# Altium footprint library JL_PCB.PCBLIB: 1112 footprints (part 52 of 71)
Each footprint in its own frame and in the unit in brackets; x right, y up, seen from the top. Pads: shape width x height; smd on the part's side, far side on the other; paste and mask are expansions set on the pad; w line width, h text height; cw(c..) or ccw(c..) is an arc to the next point about the centre after c.
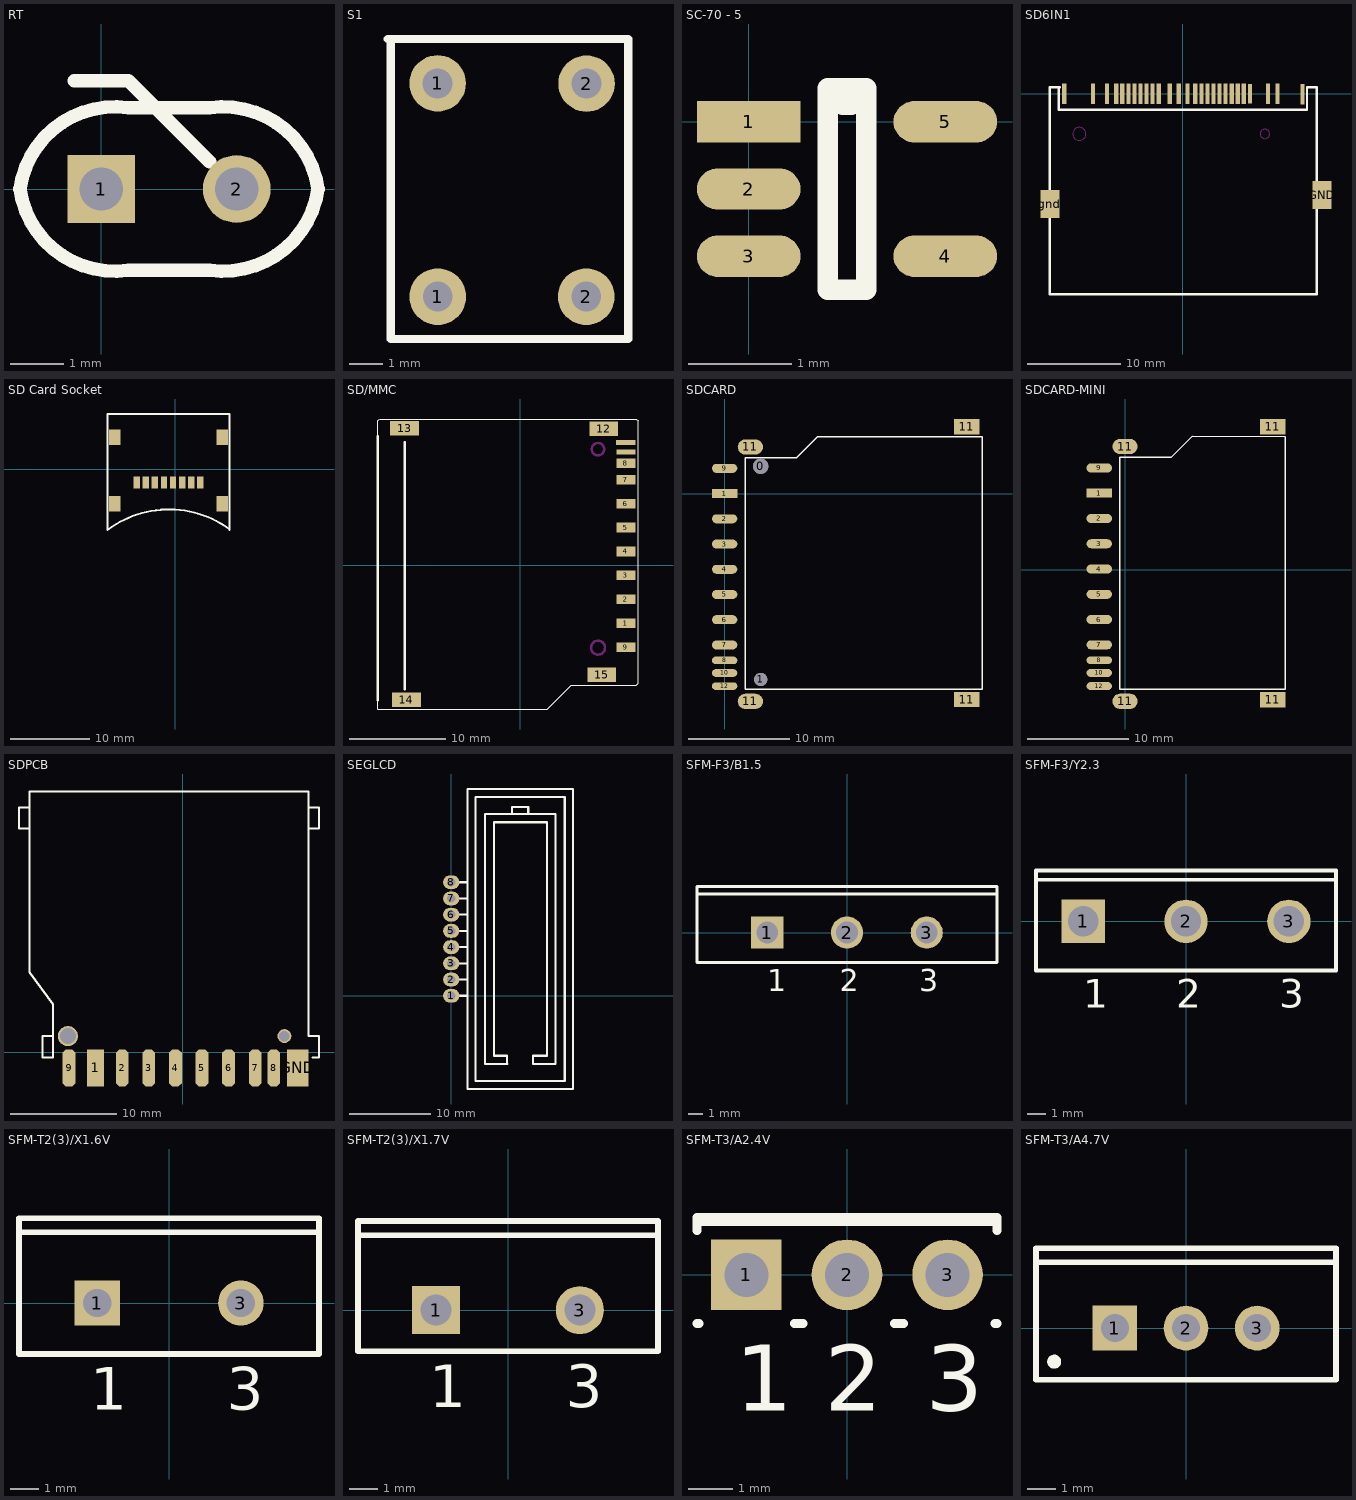
[diagram p51: the footprints below, top view; thin cyan lines are the x and y axes]

## RT [mil]
pads (2):
  rect 50x50 hole 32: 1(0,0)
  round 50 hole 32: 2(100,0)
TopOverlay:
  lines w10: -20,80 20,80 80,20 ; -60,0 ccw(c10,10) 20,-60 80,-60 ccw(c90,10) 160,0 ccw(c90,-10) 80,60 20,60 ccw(c10,-10) -60,0

## S1 [mm]
pads (4):
  round 1.7 hole 0.9: 1(13.618,-10.162) 1(13.62,-16.57) 2(18.08,-16.57) 2(18.09,-10.17)
TopOverlay:
  lines w0.254: 12.12,-8.83 19.34,-8.83 19.34,-17.84 12.21,-17.84 12.21,-8.92

## SC-70 - 5 [mm]
pads (5):
  rect 1x0.4 smd: 1(0,0)
  oval 1x0.4 smd: 2(0,-0.65) 3(0,-1.3) 4(1.9,-1.3) 5(1.9,0)
TopOverlay:
  lines w0.2: 0.765,-1.625 0.765,0.325 1.112,0.325 cw(c0.95,0.325) 0.787,0.325 1.135,0.325 1.135,-1.625 0.765,-1.625

## SD6IN1 [mm]
pads (29):
  rect 0.45x2.2 smd: 1(-9.636,-0.007) 2(-8.136,-0.007) 3(-7.136,-0.007) 4(-6.486,-0.007) 5(-5.836,-0.007) 6(-5.186,-0.007) 7(-4.536,-0.007) 8(-3.886,-0.007) 9(-3.236,-0.007) 10(-2.586,-0.007) 11(-1.396,-0.007) 12(-0.446,-0.007) 13(0.504,-0.007) 14(1.34,-0.007) 15(1.99,-0.007) 16(2.64,-0.007) 17(3.29,-0.007) 18(3.94,-0.007) 19(4.59,-0.007) 20(5.24,-0.007) 24(9.134,-0.007) 25(10.164,-0.007) 25(12.824,-0.058) 26(-12.716,-0.007)
  rect 0.44x2.2 smd: 21(5.89,-0.007) 22(6.54,-0.007)
  rect 0.45x2.1 smd: 23(7.19,-0.007)
  rect 2x3 smd: gnd(-14.246,-11.833) GND(14.929,-10.883)
TopOverlay:
  lines w0.254: -13.408,0.704 -13.306,0.704 ; -13.179,0.704 -14.271,0.704 -14.271,-21.521 14.354,-21.521 14.354,0.704 13.643,0.704 13.313,0.704 13.313,-1.709 -13.306,-1.709 ; -13.306,-1.709 -13.306,0.704 ; -13.306,-1.709 -13.306,0.704
KeepOutLayer:
  lines w0.1: -11.796,-4.307 ccw(c-11.096,-4.307) -10.396,-4.307 ccw(c-11.096,-4.307) -11.796,-4.307 ; 8.304,-4.307 ccw(c8.804,-4.307) 9.304,-4.307 ccw(c8.804,-4.307) 8.304,-4.307

## SD Card Socket [mm]
height 12.75
pads (12):
  rect 0.8x1.5 smd: 1(3.175,-1.651) 2(2.032,-1.651) 3(0.889,-1.651) 4(-0.254,-1.651) 5(-1.397,-1.651) 6(-2.54,-1.651) 7(-3.683,-1.651) 8(-4.826,-1.651)
  rect 1.45x2 smd: ""(-7.62,-4.318) ""(-7.62,4.064) ""(5.969,-4.318) ""(5.969,4.064)
TopOverlay:
  lines w0.254: 6.782,-7.471 ccw(c-0.762,-17.907) -8.509,-7.62 -8.509,6.985 6.858,6.985 6.858,-7.62

## SD/MMC [mm]
pads (15):
  rect 2x1 smd: 1(11.042,-6.055) 2(11.042,-3.555) 3(11.042,-1.055) 4(11.042,1.445) 5(11.042,3.945) 6(11.042,6.445) 7(11.042,8.945) 8(11.042,10.645) 9(11.042,-8.555)
  rect 2x0.5 smd: 10(11.042,11.839) 11(11.017,12.83)
  rect 3x1.5 smd: 12(8.727,14.275) 13(-12.073,14.3) 14(-11.873,-14.025) 15(8.527,-11.425)
TopOverlay:
  lines w0.076: -14.873,12.675 -14.873,15.075 -14.773,15.175 -14.673,15.275 12.127,15.275 12.327,15.075 12.327,-12.325 12.127,-12.525 5.327,-12.525 2.827,-15.025 -14.873,-15.025 ; -14.873,14.775 -14.873,-15.025 ; -14.873,-15.025 -14.873,-15.025
  lines w0.254: -14.873,-14.1 -14.873,13.5 ; -12.073,-12.925 -12.073,12.875
TopPaste:
  circle w0.064: c-14.659,13.624 r0.032
KeepOutLayer:
  circle w0.254: c8.127,12.125 r0.65
  circle w0.254: c8.127,-8.598 r0.727

## SDCARD [mil]
pads (17):
  round 59.06 hole 59.06: 0(140,106)
  rect 98.42x35 smd: 1(0,0)
  round 51.18 hole 51.18: 1(140,-722)
  oval 98.43x35 smd: 2(0,-98) 3(0,-196) 4(0,-294) 5(0,-392) 6(0,-490) 7(0,-588) 9(0,98)
  oval 98.42x30 smd: 8(0,-648) 10(0,-697) 12(0,-748)
  oval 98.42x59.05 smd: 11(100,-807.09) 11(100,181.1)
  rect 98.42x59.05 smd: 11(940,-800) 11(940,260)
TopOverlay:
  lines w6: 220,140 80,140 ; 780,220 1000,220 1000,-760 880,-760 ; 900,-760 80,-760 80,140 ; 900,220 360,220 280,140 80,140
3D body "User Library-2041021-4.step": height 130.52, standoff -23.02, extent 12,-820 1045.47,281.38

## SDCARD-MINI [mm]
pads (15):
  rect 2.5x0.889 smd: 1(-2.54,7.518)
  oval 2.5x0.889 smd: 2(-2.54,5.029) 3(-2.54,2.54) 4(-2.54,0.051) 5(-2.54,-2.438) 6(-2.54,-4.928) 7(-2.54,-7.417) 9(-2.54,10.008)
  oval 2.5x0.762 smd: 8(-2.54,-8.941) 10(-2.54,-10.185) 12(-2.54,-11.481)
  oval 2.5x1.5 smd: 11(0,-12.982) 11(0,12.118)
  rect 2.5x1.5 smd: 11(14.55,-12.82) 11(14.55,14.07)
TopLayer:
  lines w0.254: -0.001,12.372 0.001,11.864
TopOverlay:
  lines w0.152: 3.048,11.074 -0.508,11.074 ; -0.508,11.074 4.572,11.074 6.604,13.106 15.761,13.081 15.761,-11.811 -0.508,-11.786 -0.508,11.074

## SDPCB [mm]
height 0.254
pads (12):
  rect 1.6x3.5 smd: 1(-8.2,-1.5)
  oct 1.2x3.5 smd: 2(-5.7,-1.5) 3(-3.2,-1.5) 4(-0.7,-1.5) 5(1.8,-1.5) 6(4.3,-1.5) 7(6.8,-1.5) 8(8.55,-1.5) 9(-10.7,-1.5)
  rect 2x3.5 smd: GND(10.8,-1.5)
  round 1.9 on Top hole 1.5: ""(-10.8,1.5)
  round 1.3 on Top hole 1: ""(9.55,1.5)
TopOverlay:
  lines w0.203: -14.4,21 -15.4,21 -15.4,23 -14.4,23 ; -12.2,1.5 -13.2,1.5 -13.2,-0.5 -12.2,-0.5 -12.2,4.5 -14.4,7.5 -14.4,24.5 11.8,24.5 11.8,1.524 ; 11.8,1.5 12.8,1.5 12.8,-0.5 12.2,-0.5 ; 11.8,21 12.8,21 12.8,23 11.8,23

## SEGLCD [mm]
pads (8):
  oval 2x1.7 hole 1: 1(0,0) 2(0,2) 3(0,4) 4(0,6) 5(0,8) 6(0,10) 7(0,12) 8(0,14)
TopLayer:
  lines w0.6: -0.103,13.6 -0.003,13.5 ; -0.103,14.5 0.397,14.5
TopOverlay:
  lines w0.254: 0,0 2,0 ; 0,2 2,2 ; 0,4 2,4 ; 0,6 2,6 ; 0,8 2,8 ; 0,10 2,10 ; 0,12 2,12 ; 0,14 2,14 ; 6.9,-8.4 6.9,-8.31 6.9,-7.4 6.5,-7.4 5.3,-7.4 5.3,21.4 11.8,21.4 11.8,-7.4 10.1,-7.4 10.1,-8.41 12.845,-8.41 12.845,22.41 4.155,22.41 4.155,-8.41 6.91,-8.41 ; 7.5,22.41 7.5,23.3 9.5,23.3 9.5,22.41 ; 2,-11.5 15,-11.5 15,25.5 2,25.5 2,-11.5 ; 3,-10.5 14,-10.5 14,24.5 3,24.5 3,-10.5

## SFM-F3/B1.5 [mm] "SIP with Mounting Hole; 3 Leads; Body 26 x 20 x 5 mm (typ); Pitch 5.45 mm"
height 29
pads (3):
  rect 2.2x2.2 hole 1.5: 1(-5.45,0)
  round 2.2 hole 1.5: 2(0,0) 3(5.45,0)
TopOverlay:
  lines w0.2: -10.25,2.65 10.25,2.65 ; -10.25,-2.05 -10.25,3.15 10.25,3.15 10.25,-2.05 -10.25,-2.05
  text "3" at 4.942,-4.025 h1.5
  text "2" at -0.508,-4.025 h1.5
  text "1" at -5.45,-4.025 h1.5

## SFM-F3/Y2.3 [mm] "SIP with Mounting Hole; 3 Leads; Body 20 x 15.6 x 5 mm (typ); Pitch 5.45 mm"
height 24.6
pads (3):
  rect 2.3x2.3 hole 1.6: 1(-5.45,0)
  round 2.3 hole 1.6: 2(0,0) 3(5.45,0)
TopOverlay:
  lines w0.2: -7.95,2.2 7.95,2.2 ; -7.95,-2.6 -7.95,2.7 7.95,2.7 7.95,-2.6 -7.95,-2.6
  text "3" at 4.942,-4.575 h1.5
  text "2" at -0.508,-4.575 h1.5
  text "1" at -5.45,-4.575 h1.5

## SFM-T2(3)/X1.6V [mm] "TO, Thru-Hole, Vertical, Heatsink Mounted; 3 In-Line Leads (1 Absent); Pitch 2.54 mm"
height 19.3
pads (2):
  rect 1.6x1.6 hole 1: 1(-2.54,0)
  round 1.6 hole 1: 3(2.54,0)
TopOverlay:
  lines w0.2: -5.3,2.5 5.3,2.5 ; -5.3,-1.8 5.3,-1.8 5.3,3 -5.3,3 -5.3,-1.8
  text "3" at 2.04,-3.775 h1.5
  text "1" at -2.79,-3.775 h1.5

## SFM-T2(3)/X1.7V [mm] "TO, Thru-Hole, Vertical, Heatsink Mounted; 3 In-Line Leads (1 Absent); Pitch 2.54 mm"
height 19.2
pads (2):
  rect 1.7x1.7 hole 1.1: 1(-2.54,0)
  round 1.7 hole 1.1: 3(2.54,0)
TopOverlay:
  lines w0.2: -5.3,2.65 5.3,2.65 ; -5.3,-1.45 5.3,-1.45 5.3,3.15 -5.3,3.15 -5.3,-1.45
  text "1" at -2.79,-3.425 h1.5
  text "3" at 2.04,-3.425 h1.5

## SFM-T3/A2.4V [mm] "TO, Thru-Hole, Vertical, Heatsink Mounted; 3 In-Line Leads; Pitch 2.28 mm"
height 9.7
pads (3):
  rect 1.6x1.6 hole 1: 1(-2.28,0)
  round 1.6 hole 1: 2(0,0) 3(2.28,0)
TopOverlay:
  lines w0.2: -3.4,-1.1 -3.35,-1.1 ; -3.4,1 -3.4,1.3 3.4,1.3 3.4,1 ; -3.4,1.21 3.4,1.21 ; -1.19,-1.1 -0.99,-1.1 ; 1.08,-1.1 1.28,-1.1 ; 3.35,-1.1 3.4,-1.1
  text "3" at 1.78,-3.075 h1.5
  text "2" at -0.5,-3.075 h1.5
  text "1" at -2.53,-3.075 h1.5

## SFM-T3/A4.7V [mm] "TO, Thru-Hole, Vertical, Heatsink Mounted; 3 In-Line Leads; Pitch 2.54 mm"
height 19.3
pads (3):
  rect 1.6x1.6 hole 1: 1(-2.54,0)
  round 1.6 hole 1: 2(0,0) 3(2.54,0)
TopOverlay:
  circle w0.25: c-4.7,-1.2 r0.125
  lines w0.2: -5.35,2.35 5.35,2.35 ; -5.35,-1.85 -5.35,2.85 5.35,2.85 5.35,-1.85 -5.35,-1.85
Mechanical13:
  lines w0.1: -5.35,2.35 5.35,2.35 ; -5.35,-1.85 5.35,-1.85 5.35,2.85 -5.35,2.85 -5.35,-1.85
Mechanical15:
  lines w0.1: -0.5,0 0.5,0 ; 0,-0.5 0,0.5
3D body: height 12.9, standoff 4, extent -5.4,-1.9 5.4,2.9
3D body: height 19.3, standoff 12.9, extent -5.349,2.351 5.349,2.849